# Altium footprint library CADTchip.PcbLib: 195 footprints (part 1 of 13)
Each footprint in its own frame and in the unit in brackets; x right, y up, seen from the top. Pads: shape width x height; smd on the part's side, far side on the other; paste and mask are expansions set on the pad; w line width, h text height; cw(c..) or ccw(c..) is an arc to the next point about the centre after c.
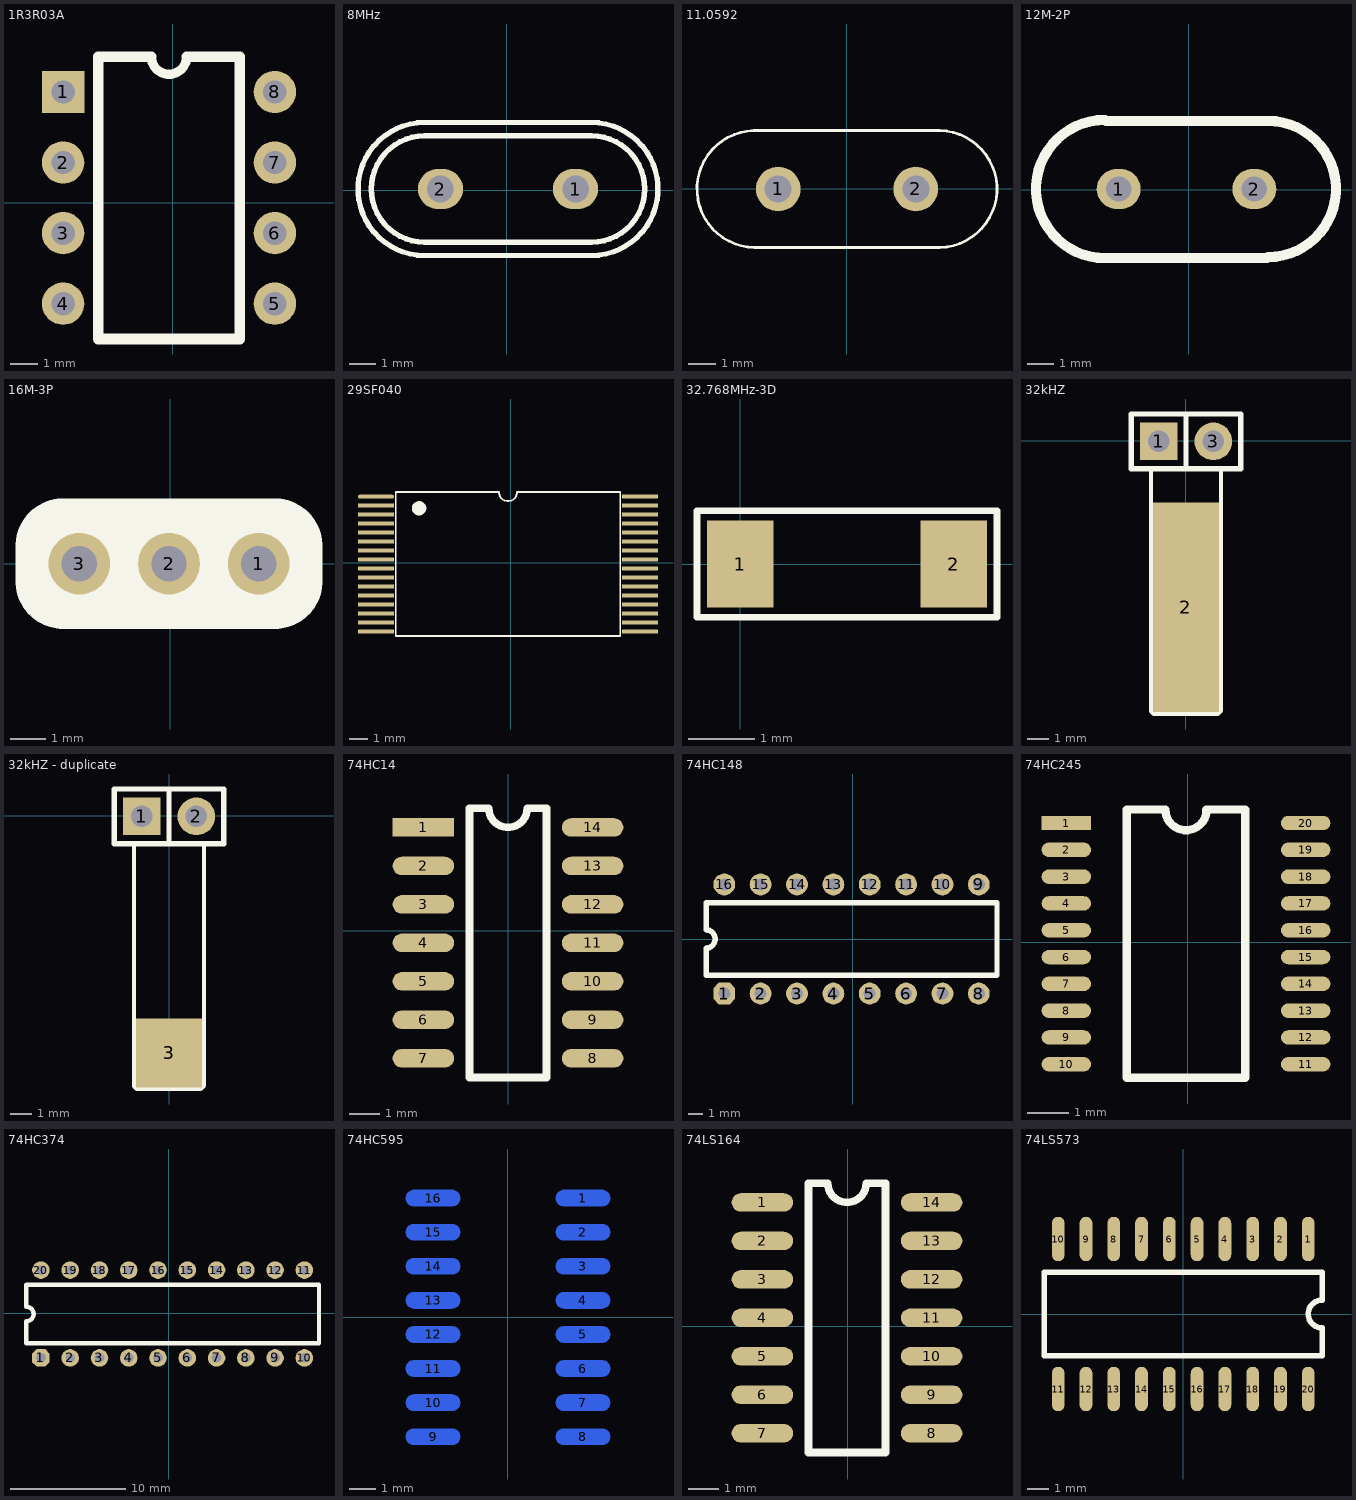
[diagram p0: the footprints below, top view; thin cyan lines are the x and y axes]

## 1R3R03A [mil]
pads (8):
  rect 60x60 hole 33: 1(-155,157)
  round 60 hole 33: 2(-155,57) 3(-155,-43) 4(-155,-143) 5(145,-143) 6(145,-43) 7(145,57) 8(145,157)
Top Overlay:
  lines w13: -30,207 ccw(c-5,207) 20,207
  lines w15: -30,207 -105,207 -105,-193 95,-193 95,207 20,207

## 8MHz [mm]
pads (2):
  oval 1.7x1.5 hole 1: 1(2.59,0.045) 2(-2.49,0.045)
Top Overlay:
  lines w0.2: -3.09,-2.455 cw(c-3.09,0.045) -3.09,2.545 3.19,2.545 cw(c3.19,0.045) 3.19,-2.455 -3.09,-2.455 ; -3.09,-1.955 cw(c-3.09,0.045) -3.09,2.045 3.19,2.045 cw(c3.19,0.045) 3.19,-1.955 -3.09,-1.955
3D body: height 3.5, standoff -3, extent -5.338,-2.204 5.462,2.296

## 11.0592 [mm]
pads (2):
  round 1.65 hole 1: 1(-2.537,-0.007) 2(2.543,-0.007)
Top Overlay:
  lines w0.1: -3.44,2.15 ccw(c-3.376,-0.008) -3.415,-2.167 ; -3.426,-2.166 3.432,-2.166 ; -3.426,2.152 3.432,2.152 ; 3.435,-2.167 ccw(c3.382,-0.008) 3.435,2.15
3D body: height 3.5, standoff -3, extent -5.388,-2.28 5.412,2.22

## 12M-2P [mm]
pads (2):
  oval 1.65x1.5 hole 0.95: 1(-2.616,0.025) 2(2.464,0.025)
Top Overlay:
  lines w0.381: -3.124,2.616 ccw(c-3.124,0.025) -3.124,-2.565 2.934,-2.565 ; -3.087,2.578 2.972,2.578 cw(c2.972,0.025) 2.972,-2.527
3D body: height 3.5, standoff -3, extent -5.49,-2.23 5.31,2.27

## 16M-3P [mm]
pads (3):
  round 1.75 hole 1: 1(2.501,0.006) 2(-0.039,0.006) 3(-2.579,0.006)
Top Overlay:
  region: 2.961,1.737 -3.039,1.737 -3.039,-1.763 2.961,-1.763
  lines w0.2: -4.289,-0.494 ccw(c-3.039,-0.494) -3.039,-1.744 2.961,-1.744 ccw(c2.961,-0.494) 4.211,-0.494 4.211,0.506 ccw(c2.961,0.506) 2.961,1.756 -3.039,1.756 ccw(c-3.039,0.506) -4.289,0.506 -4.289,-0.494
  lines w2: -3.384,-0.494 ccw(c-3.039,-0.494) -3.039,-0.839 ; -3.384,0.506 cw(c-3.039,0.506) -3.039,0.851 ; 2.961,-0.839 ccw(c2.961,-0.494) 3.306,-0.494 ; 2.961,0.851 cw(c2.961,0.506) 3.306,0.506
3D body: height 3.5, standoff -3, extent -5.439,-2.244 5.361,2.256

## 29SF040 [mm]
pads (32):
  oval 2x0.22 smd: 1(-7.493,3.683)
  rect 2x0.22 smd: 2(-7.493,3.183) 3(-7.493,2.683) 4(-7.493,2.183) 5(-7.493,1.683) 6(-7.493,1.183) 7(-7.493,0.683) 8(-7.493,0.183) 9(-7.493,-0.317) 10(-7.493,-0.817) 11(-7.493,-1.317) 12(-7.493,-1.817) 13(-7.493,-2.317) 14(-7.493,-2.817) 15(-7.493,-3.317) 16(-7.493,-3.817) 17(7.207,-3.817) 18(7.207,-3.317) 19(7.207,-2.817) 20(7.207,-2.317) 21(7.207,-1.817) 22(7.207,-1.317) 23(7.207,-0.817) 24(7.207,-0.317) 25(7.207,0.183) 26(7.207,0.683) 27(7.207,1.183) 28(7.207,1.683) 29(7.207,2.183) 30(7.207,2.683) 31(7.207,3.183) 32(7.207,3.683)
Top Overlay:
  circle w0.4: c-5.093,3.033 r0.2
  lines w0.1: -6.393,-4.067 -6.393,3.933 -0.643,3.933 ccw(c-0.143,3.933) 0.357,3.933 6.107,3.933 6.107,-4.067 -6.393,-4.067

## 32.768MHz-3D [mm]
pads (2):
  rect 1x1.3 smd: 1(0,0) 2(3.2,0)
Top Overlay:
  lines w0.1: -0.65,-0.8 3.85,-0.8 3.85,0.8 -0.65,0.8 -0.65,-0.8
3D body: height 0.81, standoff 0, extent 0,-0.762 3.2,0.738

## 32kHZ [mm]
pads (3):
  rect 1.75x1.75 hole 1: 1(-1.27,-0.025)
  rect 3.08x9.7 all layers, no hole: 2(0,-7.722)
  round 1.75 hole 1: 3(1.27,-0.025)
Top Overlay:
  lines w0.2: -1.626,-1.27 -1.626,-1.676 -1.626,-12.548 -1.499,-12.675 1.473,-12.675 1.626,-12.522 1.626,-1.295 2.54,-1.295
  lines w0.254: 0,-1.295 0,1.245 ; -2.54,-1.295 2.54,-1.295 2.54,1.245 -2.54,1.245 -2.54,-1.295

## 32kHZ - duplicate [mm]
pads (3):
  rect 1.75x1.75 hole 1: 1(-1.27,-0.025)
  round 1.75 hole 1: 2(1.27,-0.025)
  rect 3.08x3.2 all layers, no hole: 3(0,-10.998)
Top Overlay:
  lines w0.2: -1.626,-1.27 -1.626,-1.676 -1.626,-12.548 -1.499,-12.675 1.473,-12.675 1.626,-12.522 1.626,-1.295 2.54,-1.295
  lines w0.254: 0,-1.295 0,1.245 ; -2.54,-1.295 2.54,-1.295 2.54,1.245 -2.54,1.245 -2.54,-1.295

## 74HC14 [mil]
pads (14):
  rect 80x24 smd: 1(-110.04,134)
  oval 80x24 smd: 2(-110.04,84) 3(-110.04,34) 4(-110.04,-16) 5(-110.04,-66) 6(-110.04,-116) 7(-110.04,-166) 8(109.96,-166) 9(109.96,-116) 10(109.96,-66) 11(109.96,-16) 12(109.96,34) 13(109.96,84) 14(109.96,134)
Top Overlay:
  lines w10: -50.04,-191 49.96,-191 49.96,159 24.96,159 cw(c-0.04,159) -25.04,159 -50.04,159 -50.04,-191
3D body: height 61.02, standoff 0, extent -118.11,-187.27 118.11,153.28

## 74HC148 [mil]
pads (16):
  oct 60x60 hole 33: 1(-352.83,-149)
  round 60 hole 33: 2(-252.83,-149) 3(-152.83,-149) 4(-52.83,-149) 5(47.17,-149) 6(147.17,-149) 7(247.17,-149) 8(347.17,-149) 9(347.17,151) 10(247.17,151) 11(147.17,151) 12(47.17,151) 13(-52.83,151) 14(-152.83,151) 15(-252.83,151) 16(-352.83,151)
Top Overlay:
  lines w15: -402.83,-99 397.17,-99 397.17,101 -402.83,101 -402.83,26 cw(c-402.83,1) -402.83,-24 -402.83,-99

## 74HC245 [mm]
pads (20):
  rect 1.2x0.35 smd: 1(-2.938,2.893)
  oval 1.2x0.35 smd: 2(-2.938,2.243) 3(-2.938,1.594) 4(-2.938,0.943) 5(-2.938,0.294) 6(-2.938,-0.357) 7(-2.938,-1.007) 8(-2.938,-1.657) 9(-2.938,-2.307) 10(-2.938,-2.957) 11(2.862,-2.957) 12(2.862,-2.307) 13(2.862,-1.657) 14(2.862,-1.007) 15(2.862,-0.357) 16(2.862,0.294) 17(2.862,0.943) 18(2.862,1.594) 19(2.862,2.243) 20(2.862,2.893)
Top Overlay:
  lines w0.2: -0.544,3.213 -1.473,3.218 -1.473,-3.282 1.397,-3.282 1.397,3.218 0.451,3.213 ; -0.538,3.218 ccw(c-0.038,3.218) 0.462,3.218

## 74HC374 [mil]
pads (20):
  oct 60x60 hole 33: 1(-436,-152)
  round 60 hole 33: 2(-336,-152) 3(-236,-152) 4(-136,-152) 5(-36,-152) 6(64,-152) 7(164,-152) 8(264,-152) 9(364,-152) 10(464,-152) 11(464,148) 12(364,148) 13(264,148) 14(164,148) 15(64,148) 16(-36,148) 17(-136,148) 18(-236,148) 19(-336,148) 20(-436,148)
Top Overlay:
  lines w15: -486,-102 514,-102 514,98 -486,98 -486,23 cw(c-486,-2) -486,-27 -486,-102

## 74HC595 [mil]
pads (16):
  oval 80x24 smd far side: 1(110,175) 2(110,125) 3(110,75) 4(110,25) 5(110,-25) 6(110,-75) 7(110,-125) 8(110,-175) 9(-110,-175) 10(-110,-125) 11(-110,-75) 12(-110,-25) 13(-110,25) 14(-110,75) 15(-110,125) 16(-110,175)
Bottom Overlay:
  lines w10: -50,-200 50,-200 50,200 25,200 cw(c0,200) -25,200 -50,200 -50,-200

## 74LS164 [mil]
pads (14):
  oval 80x24 smd: 1(-111.2,160.86) 2(-111.2,110.86) 3(-111.2,60.86) 4(-111.2,10.86) 5(-111.2,-39.14) 6(-111.2,-89.14) 7(-111.2,-139.14) 8(108.8,-139.14) 9(108.8,-89.14) 10(108.8,-39.14) 11(108.8,10.86) 12(108.8,60.86) 13(108.8,110.86) 14(108.8,160.86)
Top Overlay:
  lines w10: -51.2,-164.14 48.8,-164.14 48.8,185.86 23.8,185.86 cw(c-1.2,185.86) -26.2,185.86 -51.2,185.86 -51.2,-164.14
3D body: height 61.02, standoff 0, extent -116.11,-159.27 120.11,181.28

## 74LS573 [mil]
pads (20):
  oval 23x80 smd: 1(225,135) 2(175,135) 3(125,135) 4(75,135) 5(25,135) 6(-25,135) 7(-75,135) 8(-125,135) 9(-175,135) 10(-225,135) 11(-225,-135) 12(-175,-135) 13(-125,-135) 14(-75,-135) 15(-25,-135) 16(25,-135) 17(75,-135) 18(125,-135) 19(175,-135) 20(225,-135)
Top Overlay:
  lines w10: -250,-75 -250,75 250,75 250,25 ccw(c250,0) 250,-25 250,-75 -250,-75